# Altium footprint library Package_SO.PcbLib: 333 footprints (part 13 of 21)
Each footprint in its own frame and in the unit in brackets; x right, y up, seen from the top. Pads: shape width x height; smd on the part's side, far side on the other; paste and mask are expansions set on the pad; w line width, h text height; cw(c..) or ccw(c..) is an arc to the next point about the centre after c.
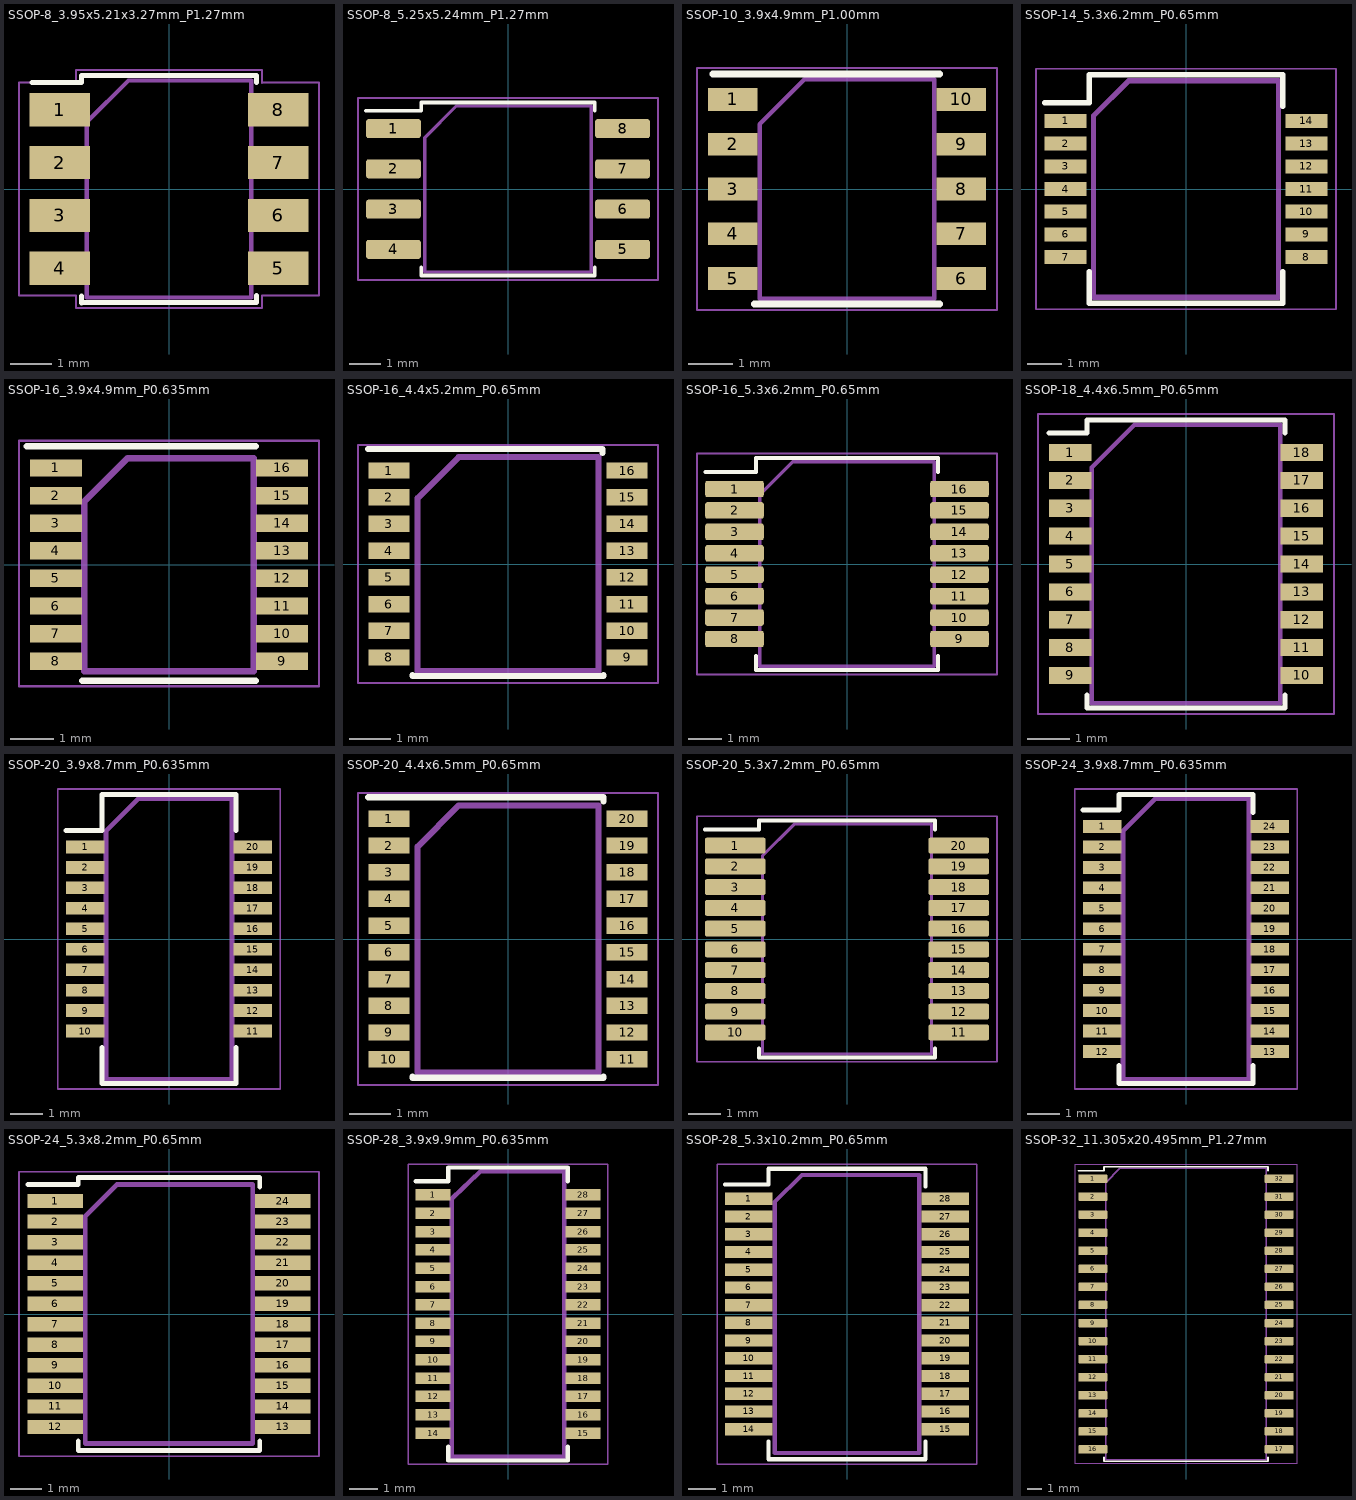
[diagram p12: the footprints below, top view; thin cyan lines are the x and y axes]

## SSOP-8_3.95x5.21x3.27mm_P1.27mm [mm]
pads (8):
  rect 1.45x0.8 smd: 1(-2.625,1.905) 2(-2.625,0.635) 3(-2.625,-0.635) 4(-2.625,-1.905) 5(2.625,-1.905) 6(2.625,-0.635) 7(2.625,0.635) 8(2.625,1.905)
F.SilkS:
  lines w0.12: -3.29,2.56 -2.1,2.56 -2.1,2.73 2.1,2.73 2.1,2.56 ; -2.1,-2.74 -2.1,-2.57 ; -2.1,-2.73 2.1,-2.73 2.1,-2.56
F.CrtYd:
  lines w0.05: 2.23,2.55 2.23,2.85 ; 2.23,2.56 3.6,2.56 3.6,-2.56 2.23,-2.56 2.23,-2.86 -2.23,-2.86 -2.23,-2.56 -3.6,-2.56 -3.6,2.56 -2.23,2.56 -2.23,2.86 2.23,2.86
F.Fab:
  lines w0.1: -1.975,-2.605 -1.975,1.605 -0.975,2.605 1.975,2.605 1.975,-2.605 -1.975,-2.605
  text "'.Designator'" at -2.488,-0.564 h0.6

## SSOP-8_5.25x5.24mm_P1.27mm [mm]
pads (8):
  rrect25% 1.725x0.6 smd: 1(-3.612,1.905) 2(-3.612,0.635) 3(-3.612,-0.635) 4(-3.612,-1.905) 5(3.612,-1.905) 6(3.612,-0.635) 7(3.612,0.635) 8(3.612,1.905)
F.SilkS:
  lines w0.12: -4.475,2.465 -2.735,2.465 -2.735,2.73 0,2.73 2.735,2.73 2.735,2.465 ; -2.735,-2.465 -2.735,-2.73 0,-2.73 2.735,-2.73 2.735,-2.465
F.CrtYd:
  lines w0.05: -4.73,-2.87 4.73,-2.87 4.73,2.87 -4.73,2.87 -4.73,-2.87
F.Fab:
  lines w0.1: -2.625,-2.62 2.625,-2.62 2.625,2.62 -1.625,2.62 -2.625,1.62 -2.625,-2.62
  text "'.Designator'" at -4.047,-0.84 h1

## SSOP-10_3.9x4.9mm_P1.00mm [mm]
pads (10):
  rect 1.1x0.51 smd: 1(-2.55,2) 2(-2.55,1) 3(-2.55,0) 4(-2.55,-1) 5(-2.55,-2) 6(2.55,-2) 7(2.55,-1) 8(2.55,0) 9(2.55,1) 10(2.55,2)
F.SilkS:
  lines w0.15: -3,2.57 2.07,2.57 ; -2.07,-2.57 2.07,-2.57
F.CrtYd:
  lines w0.05: -3.35,-2.7 3.35,-2.7 3.35,2.7 -3.35,2.7 -3.35,-2.7
F.Fab:
  lines w0.1: -1.95,-2.45 -1.95,1.45 -0.95,2.45 1.95,2.45 1.95,-2.45 -1.95,-2.45
  text "'.Designator'" at -4.047,-0.84 h1

## SSOP-14_5.3x6.2mm_P0.65mm [mm]
pads (14):
  rect 1.2x0.4 smd: 1(-3.45,1.95) 2(-3.45,1.3) 3(-3.45,0.65) 4(-3.45,0) 5(-3.45,-0.65) 6(-3.45,-1.3) 7(-3.45,-1.95) 8(3.45,-1.95) 9(3.45,-1.3) 10(3.45,-0.65) 11(3.45,0) 12(3.45,0.65) 13(3.45,1.3) 14(3.45,1.95)
F.SilkS:
  lines w0.15: -4.05,2.475 -2.775,2.475 -2.775,3.275 2.775,3.275 2.775,2.375 ; -2.775,-2.375 -2.775,-3.275 2.775,-3.275 2.775,-2.375
F.CrtYd:
  lines w0.05: -4.3,-3.45 -4.3,3.45 4.3,3.45 4.3,-3.45 -4.3,-3.45
F.Fab:
  lines w0.15: -2.65,-3.1 2.65,-3.1 2.65,3.1 -1.65,3.1 -2.65,2.1 -2.65,-3.1
  text "'.Designator'" at -3.267,-0.702 h0.8

## SSOP-16_3.9x4.9mm_P0.635mm [mm]
pads (16):
  rect 1.2x0.4 smd: 1(-2.6,2.222) 2(-2.6,1.587) 3(-2.6,0.953) 4(-2.6,0.318) 5(-2.6,-0.318) 6(-2.6,-0.953) 7(-2.6,-1.587) 8(-2.6,-2.222) 9(2.6,-2.222) 10(2.6,-1.587) 11(2.6,-0.953) 12(2.6,-0.318) 13(2.6,0.318) 14(2.6,0.953) 15(2.6,1.587) 16(2.6,2.222)
F.SilkS:
  lines w0.15: -3.275,2.725 2,2.725 ; -2,-2.675 2,-2.675
F.CrtYd:
  lines w0.05: -3.45,-2.8 3.45,-2.8 3.45,2.85 -3.45,2.85 -3.45,-2.8
F.Fab:
  lines w0.15: -1.95,-2.45 1.95,-2.45 1.95,2.45 -0.95,2.45 -1.95,1.45 -1.95,-2.45
  text "'.Designator'" at -3.267,-0.702 h0.8

## SSOP-16_4.4x5.2mm_P0.65mm [mm]
pads (16):
  rect 1x0.4 smd: 1(-2.9,2.275) 2(-2.9,1.625) 3(-2.9,0.975) 4(-2.9,0.325) 5(-2.9,-0.325) 6(-2.9,-0.975) 7(-2.9,-1.625) 8(-2.9,-2.275) 9(2.9,-2.275) 10(2.9,-1.625) 11(2.9,-0.975) 12(2.9,-0.325) 13(2.9,0.325) 14(2.9,0.975) 15(2.9,1.625) 16(2.9,2.275)
F.SilkS:
  lines w0.15: -3.4,2.8 2.3,2.8 2.3,2.7 ; -2.325,-2.7 -2.325,-2.725 2.325,-2.725 2.325,-2.7
F.CrtYd:
  lines w0.05: -3.65,-2.9 -3.65,2.9 3.65,2.9 3.65,-2.9 -3.65,-2.9
F.Fab:
  lines w0.15: -2.2,-2.6 -2.2,1.6 -1.2,2.6 2.2,2.6 2.2,-2.6 -2.2,-2.6
  text "'.Designator'" at -3.267,-0.702 h0.8

## SSOP-16_5.3x6.2mm_P0.65mm [mm]
pads (16):
  rrect25% 1.775x0.5 smd: 1(-3.413,2.275) 2(-3.413,1.625) 3(-3.413,0.975) 4(-3.413,0.325) 5(-3.413,-0.325) 6(-3.413,-0.975) 7(-3.413,-1.625) 8(-3.413,-2.275) 9(3.413,-2.275) 10(3.413,-1.625) 11(3.413,-0.975) 12(3.413,-0.325) 13(3.413,0.325) 14(3.413,0.975) 15(3.413,1.625) 16(3.413,2.275)
F.SilkS:
  lines w0.12: -4.3,2.785 -2.76,2.785 -2.76,3.21 0,3.21 2.76,3.21 2.76,2.785 ; -2.76,-2.785 -2.76,-3.21 0,-3.21 2.76,-3.21 2.76,-2.785
F.CrtYd:
  lines w0.05: -4.55,-3.35 -4.55,3.35 4.55,3.35 4.55,-3.35 -4.55,-3.35
F.Fab:
  lines w0.1: -2.65,-3.1 -2.65,2.1 -1.65,3.1 2.65,3.1 2.65,-3.1 -2.65,-3.1
  text "'.Designator'" at -4.047,-0.84 h1

## SSOP-18_4.4x6.5mm_P0.65mm [mm]
pads (18):
  rect 1x0.4 smd: 1(-2.7,2.6) 2(-2.7,1.95) 3(-2.7,1.3) 4(-2.7,0.65) 5(-2.7,0) 6(-2.7,-0.65) 7(-2.7,-1.3) 8(-2.7,-1.95) 9(-2.7,-2.6) 10(2.7,-2.6) 11(2.7,-1.95) 12(2.7,-1.3) 13(2.7,-0.65) 14(2.7,0) 15(2.7,0.65) 16(2.7,1.3) 17(2.7,1.95) 18(2.7,2.6)
F.SilkS:
  lines w0.12: -3.2,3.06 -2.31,3.06 -2.31,3.36 2.31,3.36 2.31,3.06 ; -2.31,-3.06 -2.31,-3.36 2.31,-3.36 2.31,-3.06
F.CrtYd:
  lines w0.05: -3.45,-3.5 -3.45,3.5 3.45,3.5 3.45,-3.5 -3.45,-3.5
F.Fab:
  lines w0.1: -2.2,-3.25 2.2,-3.25 2.2,3.25 -1.2,3.25 -2.2,2.25 -2.2,-3.25
  text "'.Designator'" at -4.047,-0.84 h1

## SSOP-20_3.9x8.7mm_P0.635mm [mm]
pads (20):
  rect 1.2x0.4 smd: 1(-2.6,2.857) 2(-2.6,2.222) 3(-2.6,1.587) 4(-2.6,0.953) 5(-2.6,0.318) 6(-2.6,-0.318) 7(-2.6,-0.953) 8(-2.6,-1.587) 9(-2.6,-2.222) 10(-2.6,-2.857) 11(2.6,-2.857) 12(2.6,-2.222) 13(2.6,-1.587) 14(2.6,-0.953) 15(2.6,-0.318) 16(2.6,0.318) 17(2.6,0.953) 18(2.6,1.587) 19(2.6,2.222) 20(2.6,2.857)
F.SilkS:
  lines w0.15: -3.2,3.365 -2.075,3.365 -2.075,4.475 2.075,4.475 2.075,3.365 ; -2.075,-3.365 -2.075,-4.475 2.075,-4.475 2.075,-3.365
F.CrtYd:
  lines w0.05: -3.45,-4.65 -3.45,4.65 3.45,4.65 3.45,-4.65 -3.45,-4.65
F.Fab:
  lines w0.15: -1.95,-4.35 1.95,-4.35 1.95,4.35 -0.95,4.35 -1.95,3.35 -1.95,-4.35
  text "'.Designator'" at -3.267,-0.702 h0.8

## SSOP-20_4.4x6.5mm_P0.65mm [mm]
pads (20):
  rect 1x0.4 smd: 1(-2.9,2.925) 2(-2.9,2.275) 3(-2.9,1.625) 4(-2.9,0.975) 5(-2.9,0.325) 6(-2.9,-0.325) 7(-2.9,-0.975) 8(-2.9,-1.625) 9(-2.9,-2.275) 10(-2.9,-2.925) 11(2.9,-2.925) 12(2.9,-2.275) 13(2.9,-1.625) 14(2.9,-0.975) 15(2.9,-0.325) 16(2.9,0.325) 17(2.9,0.975) 18(2.9,1.625) 19(2.9,2.275) 20(2.9,2.925)
F.SilkS:
  lines w0.15: -3.4,3.45 2.325,3.45 2.325,3.35 ; -2.325,-3.35 -2.325,-3.375 2.325,-3.375 2.325,-3.35
F.CrtYd:
  lines w0.05: -3.65,-3.55 3.65,-3.55 3.65,3.55 -3.65,3.55 -3.65,-3.55
F.Fab:
  lines w0.15: -2.2,-3.25 -2.2,2.25 -1.2,3.25 2.2,3.25 2.2,-3.25 -2.2,-3.25
  text "'.Designator'" at -3.267,-0.702 h0.8

## SSOP-20_5.3x7.2mm_P0.65mm [mm]
pads (20):
  rrect25% 1.9x0.5 smd: 1(-3.5,2.925) 2(-3.5,2.275) 3(-3.5,1.625) 4(-3.5,0.975) 5(-3.5,0.325) 6(-3.5,-0.325) 7(-3.5,-0.975) 8(-3.5,-1.625) 9(-3.5,-2.275) 10(-3.5,-2.925) 11(3.5,-2.925) 12(3.5,-2.275) 13(3.5,-1.625) 14(3.5,-0.975) 15(3.5,-0.325) 16(3.5,0.325) 17(3.5,0.975) 18(3.5,1.625) 19(3.5,2.275) 20(3.5,2.925)
F.SilkS:
  lines w0.12: -4.45,3.435 -2.76,3.435 -2.76,3.71 0,3.71 2.76,3.71 2.76,3.435 ; -2.76,-3.435 -2.76,-3.71 0,-3.71 2.76,-3.71 2.76,-3.435
F.CrtYd:
  lines w0.05: -4.7,-3.85 4.7,-3.85 4.7,3.85 -4.7,3.85 -4.7,-3.85
F.Fab:
  lines w0.1: -2.65,-3.6 -2.65,2.6 -1.65,3.6 2.65,3.6 2.65,-3.6 -2.65,-3.6
  text "'.Designator'" at -4.047,-0.84 h1

## SSOP-24_3.9x8.7mm_P0.635mm [mm]
pads (24):
  rect 1.2x0.4 smd: 1(-2.6,3.492) 2(-2.6,2.857) 3(-2.6,2.222) 4(-2.6,1.587) 5(-2.6,0.953) 6(-2.6,0.318) 7(-2.6,-0.318) 8(-2.6,-0.953) 9(-2.6,-1.587) 10(-2.6,-2.222) 11(-2.6,-2.857) 12(-2.6,-3.492) 13(2.6,-3.492) 14(2.6,-2.857) 15(2.6,-2.222) 16(2.6,-1.587) 17(2.6,-0.953) 18(2.6,-0.318) 19(2.6,0.318) 20(2.6,0.953) 21(2.6,1.587) 22(2.6,2.222) 23(2.6,2.857) 24(2.6,3.492)
F.SilkS:
  lines w0.15: -3.2,4 -2.075,4 -2.075,4.475 2.075,4.475 2.075,3.918 ; -2.075,-3.918 -2.075,-4.475 2.075,-4.475 2.075,-3.918
F.CrtYd:
  lines w0.05: -3.45,-4.65 -3.45,4.65 3.45,4.65 3.45,-4.65 -3.45,-4.65
F.Fab:
  lines w0.15: -1.95,-4.35 1.95,-4.35 1.95,4.35 -0.95,4.35 -1.95,3.35 -1.95,-4.35
  text "'.Designator'" at -3.267,-0.702 h0.8

## SSOP-24_5.3x8.2mm_P0.65mm [mm]
pads (24):
  rect 1.75x0.45 smd: 1(-3.6,3.575) 2(-3.6,2.925) 3(-3.6,2.275) 4(-3.6,1.625) 5(-3.6,0.975) 6(-3.6,0.325) 7(-3.6,-0.325) 8(-3.6,-0.975) 9(-3.6,-1.625) 10(-3.6,-2.275) 11(-3.6,-2.925) 12(-3.6,-3.575) 13(3.6,-3.575) 14(3.6,-2.925) 15(3.6,-2.275) 16(3.6,-1.625) 17(3.6,-0.975) 18(3.6,-0.325) 19(3.6,0.325) 20(3.6,0.975) 21(3.6,1.625) 22(3.6,2.275) 23(3.6,2.925) 24(3.6,3.575)
F.SilkS:
  lines w0.15: -4.475,4.1 -2.875,4.1 -2.875,4.325 2.875,4.325 2.875,4.025 ; -2.875,-4.025 -2.875,-4.325 2.875,-4.325 2.875,-4.025
F.CrtYd:
  lines w0.05: -4.75,-4.5 4.75,-4.5 4.75,4.5 -4.75,4.5 -4.75,-4.5
F.Fab:
  lines w0.15: -2.65,-4.1 2.65,-4.1 2.65,4.1 -1.65,4.1 -2.65,3.1 -2.65,-4.1
  text "'.Designator'" at -3.267,-0.702 h0.8

## SSOP-28_3.9x9.9mm_P0.635mm [mm]
pads (28):
  rect 1.2x0.4 smd: 1(-2.6,4.127) 2(-2.6,3.492) 3(-2.6,2.857) 4(-2.6,2.222) 5(-2.6,1.587) 6(-2.6,0.953) 7(-2.6,0.318) 8(-2.6,-0.318) 9(-2.6,-0.953) 10(-2.6,-1.587) 11(-2.6,-2.222) 12(-2.6,-2.857) 13(-2.6,-3.492) 14(-2.6,-4.127) 15(2.6,-4.127) 16(2.6,-3.492) 17(2.6,-2.857) 18(2.6,-2.222) 19(2.6,-1.587) 20(2.6,-0.953) 21(2.6,-0.318) 22(2.6,0.318) 23(2.6,0.953) 24(2.6,1.587) 25(2.6,2.222) 26(2.6,2.857) 27(2.6,3.492) 28(2.6,4.127)
F.SilkS:
  lines w0.15: -3.2,4.6 -2.075,4.6 -2.075,5.08 2.075,5.08 2.075,4.6 ; -2.075,-4.6 -2.075,-5.08 2.075,-5.08 2.075,-4.6
F.CrtYd:
  lines w0.05: -3.45,-5.2 -3.45,5.2 3.45,5.2 3.45,-5.2 -3.45,-5.2
F.Fab:
  lines w0.15: -1.95,-4.95 1.95,-4.95 1.95,4.95 -0.95,4.95 -1.95,4 -1.95,-4.95
  text "'.Designator'" at -3.267,-0.702 h0.8

## SSOP-28_5.3x10.2mm_P0.65mm [mm]
pads (28):
  rect 1.75x0.45 smd: 1(-3.6,4.225) 2(-3.6,3.575) 3(-3.6,2.925) 4(-3.6,2.275) 5(-3.6,1.625) 6(-3.6,0.975) 7(-3.6,0.325) 8(-3.6,-0.325) 9(-3.6,-0.975) 10(-3.6,-1.625) 11(-3.6,-2.275) 12(-3.6,-2.925) 13(-3.6,-3.575) 14(-3.6,-4.225) 15(3.6,-4.225) 16(3.6,-3.575) 17(3.6,-2.925) 18(3.6,-2.275) 19(3.6,-1.625) 20(3.6,-0.975) 21(3.6,-0.325) 22(3.6,0.325) 23(3.6,0.975) 24(3.6,1.625) 25(3.6,2.275) 26(3.6,2.925) 27(3.6,3.575) 28(3.6,4.225)
F.SilkS:
  lines w0.15: -4.475,4.75 -2.875,4.75 -2.875,5.325 2.875,5.325 2.875,4.675 ; -2.875,-4.675 -2.875,-5.325 2.875,-5.325 2.875,-4.675
F.CrtYd:
  lines w0.05: -4.75,-5.5 -4.75,5.5 4.75,5.5 4.75,-5.5 -4.75,-5.5
F.Fab:
  lines w0.15: -2.65,-5.1 -2.65,4.1 -1.65,5.1 2.65,5.1 2.65,-5.1 -2.65,-5.1
  text "'.Designator'" at -3.267,-0.702 h0.8

## SSOP-32_11.305x20.495mm_P1.27mm [mm]
pads (32):
  rrect25% 2.05x0.6 smd: 1(-6.55,9.525) 2(-6.55,8.255) 3(-6.55,6.985) 4(-6.55,5.715) 5(-6.55,4.445) 6(-6.55,3.175) 7(-6.55,1.905) 8(-6.55,0.635) 9(-6.55,-0.635) 10(-6.55,-1.905) 11(-6.55,-3.175) 12(-6.55,-4.445) 13(-6.55,-5.715) 14(-6.55,-6.985) 15(-6.55,-8.255) 16(-6.55,-9.525) 17(6.55,-9.525) 18(6.55,-8.255) 19(6.55,-6.985) 20(6.55,-5.715) 21(6.55,-4.445) 22(6.55,-3.175) 23(6.55,-1.905) 24(6.55,-0.635) 25(6.55,0.635) 26(6.55,1.905) 27(6.55,3.175) 28(6.55,4.445) 29(6.55,5.715) 30(6.55,6.985) 31(6.55,8.255) 32(6.55,9.525)
F.SilkS:
  lines w0.12: -7.575,10.085 -5.763,10.085 -5.763,10.358 0,10.358 5.763,10.358 5.763,10.085 ; -5.763,-10.085 -5.763,-10.358 0,-10.358 5.763,-10.358 5.763,-10.085
F.CrtYd:
  lines w0.05: -7.83,-10.5 -7.83,10.5 7.83,10.5 7.83,-10.5 -7.83,-10.5
F.Fab:
  lines w0.1: -5.653,-10.248 5.653,-10.248 5.653,10.248 -4.653,10.248 -5.653,9.247 -5.653,-10.248
  text "'.Designator'" at -4.047,-0.84 h1